# Altium footprint library ACTION_IC.PcbLib: 137 footprints (part 7 of 9)
Each footprint in its own frame and in the unit in brackets; x right, y up, seen from the top. Pads: shape width x height; smd on the part's side, far side on the other; paste and mask are expansions set on the pad; w line width, h text height; cw(c..) or ccw(c..) is an arc to the next point about the centre after c.
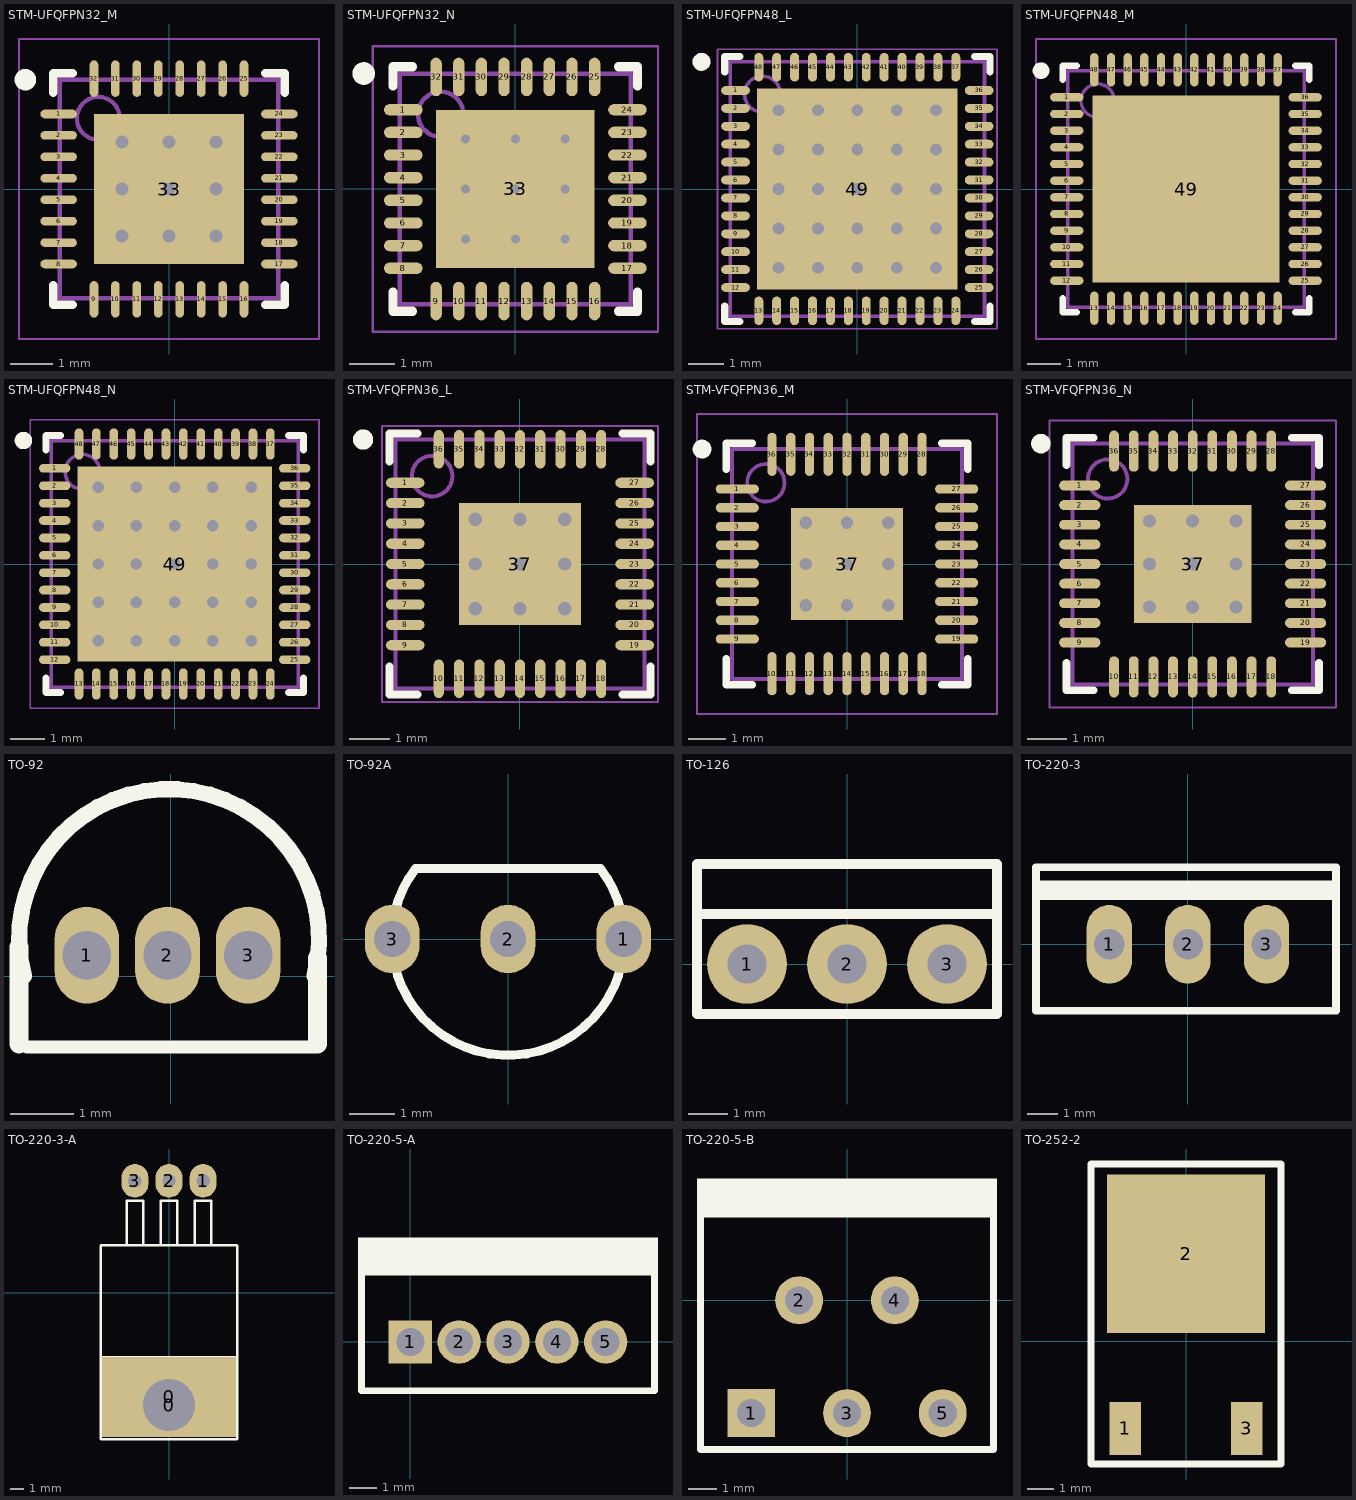
[diagram p6: the footprints below, top view; thin cyan lines are the x and y axes]

## STM-UFQFPN32_M [mm] "QFN, 32-Leads, Body 5.1x5.1mm, Pitch 0.5mm, Thermal Pad 3.5x3.5mm, IPC Low Density"
height 0.6
pads (33):
  oval 0.85x0.2 smd: 1(-2.575,1.75) 2(-2.575,1.25) 3(-2.575,0.75) 4(-2.575,0.25) 5(-2.575,-0.25) 6(-2.575,-0.75) 7(-2.575,-1.25) 8(-2.575,-1.75) 17(2.575,-1.75) 18(2.575,-1.25) 19(2.575,-0.75) 20(2.575,-0.25) 21(2.575,0.25) 22(2.575,0.75) 23(2.575,1.25) 24(2.575,1.75)
  oval 0.2x0.85 smd: 9(-1.75,-2.575) 10(-1.25,-2.575) 11(-0.75,-2.575) 12(-0.25,-2.575) 13(0.25,-2.575) 14(0.75,-2.575) 15(1.25,-2.575) 16(1.75,-2.575) 25(1.75,2.575) 26(1.25,2.575) 27(0.75,2.575) 28(0.25,2.575) 29(-0.25,2.575) 30(-0.75,2.575) 31(-1.25,2.575) 32(-1.75,2.575)
  rect 3.5x3.5 smd: 33(0,0)
via -1.1,1.1 diameter 0.5 hole 0.3
via 0,1.1 diameter 0.5 hole 0.3
via 1.1,1.1 diameter 0.5 hole 0.3
via -1.1,0 diameter 0.5 hole 0.3
via 0,0 diameter 0.5 hole 0.3
via 1.1,0 diameter 0.5 hole 0.3
via -1.1,-1.1 diameter 0.5 hole 0.3
via 0,-1.1 diameter 0.5 hole 0.3
via 1.1,-1.1 diameter 0.5 hole 0.3
Top Overlay:
  circle w0.25: c-3.35,2.55 r0.125
  lines w0.2: -2.7,-2.25 -2.7,-2.7 -2.25,-2.7 ; -2.7,2.25 -2.7,2.7 -2.25,2.7 ; 2.25,-2.7 2.7,-2.7 2.7,-2.25 ; 2.25,2.7 2.7,2.7 2.7,2.25
Mechanical 13:
  circle w0.1: c-1.65,1.65 r0.5
  lines w0.1: -2.55,-2.55 -2.55,2.55 2.55,2.55 2.55,-2.55 -2.55,-2.55
Mechanical 15:
  lines w0.05: -3.5,-3.5 -3.5,3.5 3.5,3.5 3.5,-3.5 -3.5,-3.5
  lines w0.1: -0.5,0 0.5,0 ; 0,-0.5 0,0.5
3D body: height 0.6, standoff 0, extent -2.55,-2.55 2.55,2.55

## STM-UFQFPN32_N [mm] "QFN, 32-Leads, Body 5.1x5.1mm, Pitch 0.5mm, Thermal Pad 3.5x3.5mm, IPC Medium Density"
height 0.6
pads (33):
  oval 0.85x0.25 smd: 1(-2.475,1.75) 2(-2.475,1.25) 3(-2.475,0.75) 4(-2.475,0.25) 5(-2.475,-0.25) 6(-2.475,-0.75) 7(-2.475,-1.25) 8(-2.475,-1.75) 17(2.475,-1.75) 18(2.475,-1.25) 19(2.475,-0.75) 20(2.475,-0.25) 21(2.475,0.25) 22(2.475,0.75) 23(2.475,1.25) 24(2.475,1.75)
  oval 0.25x0.85 smd: 9(-1.75,-2.475) 10(-1.25,-2.475) 11(-0.75,-2.475) 12(-0.25,-2.475) 13(0.25,-2.475) 14(0.75,-2.475) 15(1.25,-2.475) 16(1.75,-2.475) 25(1.75,2.475) 26(1.25,2.475) 27(0.75,2.475) 28(0.25,2.475) 29(-0.25,2.475) 30(-0.75,2.475) 31(-1.25,2.475) 32(-1.75,2.475)
  rect 3.5x3.5 smd: 33(0,0)
via 1.1,-1.1 diameter 0.5 hole 0.2
via 0,-1.1 diameter 0.5 hole 0.2
via -1.1,-1.1 diameter 0.5 hole 0.2
via 1.1,0 diameter 0.5 hole 0.2
via 0,0 diameter 0.5 hole 0.2
via -1.1,0 diameter 0.5 hole 0.2
via 1.1,1.1 diameter 0.5 hole 0.2
via 0,1.1 diameter 0.5 hole 0.2
via -1.1,1.1 diameter 0.5 hole 0.2
Top Overlay:
  circle w0.25: c-3.35,2.55 r0.125
  lines w0.2: -2.7,-2.275 -2.7,-2.7 -2.275,-2.7 ; -2.7,2.275 -2.7,2.7 -2.275,2.7 ; 2.275,-2.7 2.7,-2.7 2.7,-2.275 ; 2.275,2.7 2.7,2.7 2.7,2.275
Mechanical 13:
  circle w0.1: c-1.65,1.65 r0.5
  lines w0.1: -2.55,-2.55 2.55,-2.55 2.55,2.55 -2.55,2.55 -2.55,-2.55
Mechanical 15:
  lines w0.05: -3.15,-3.15 3.15,-3.15 3.15,3.15 -3.15,3.15 -3.15,-3.15
  lines w0.1: -0.5,0 0.5,0 ; 0,-0.5 0,0.5
3D body: height 0.6, standoff 0, extent -2.55,-2.55 2.55,2.55

## STM-UFQFPN48_L [mm] "QFN, 48-Leads, Body 7.1x7.1mm, Pitch 0.5mm, Thermal Pad 5.6x5.6mm, IPC High Density"
height 0.6
pads (49):
  oval 0.8x0.25 smd: 1(-3.4,2.75) 2(-3.4,2.25) 3(-3.4,1.75) 4(-3.4,1.25) 5(-3.4,0.75) 6(-3.4,0.25) 7(-3.4,-0.25) 8(-3.4,-0.75) 9(-3.4,-1.25) 10(-3.4,-1.75) 11(-3.4,-2.25) 12(-3.4,-2.75) 25(3.4,-2.75) 26(3.4,-2.25) 27(3.4,-1.75) 28(3.4,-1.25) 29(3.4,-0.75) 30(3.4,-0.25) 31(3.4,0.25) 32(3.4,0.75) 33(3.4,1.25) 34(3.4,1.75) 35(3.4,2.25) 36(3.4,2.75)
  oval 0.25x0.8 smd: 13(-2.75,-3.4) 14(-2.25,-3.4) 15(-1.75,-3.4) 16(-1.25,-3.4) 17(-0.75,-3.4) 18(-0.25,-3.4) 19(0.25,-3.4) 20(0.75,-3.4) 21(1.25,-3.4) 22(1.75,-3.4) 23(2.25,-3.4) 24(2.75,-3.4) 37(2.75,3.4) 38(2.25,3.4) 39(1.75,3.4) 40(1.25,3.4) 41(0.75,3.4) 42(0.25,3.4) 43(-0.25,3.4) 44(-0.75,3.4) 45(-1.25,3.4) 46(-1.75,3.4) 47(-2.25,3.4) 48(-2.75,3.4)
  rect 5.6x5.6 smd: 49(0,0)
via 2.2,-2.2 diameter 0.66 hole 0.33
via 1.1,-2.2 diameter 0.66 hole 0.33
via 0,-2.2 diameter 0.66 hole 0.33
via -1.1,-2.2 diameter 0.66 hole 0.33
via -2.2,-2.2 diameter 0.66 hole 0.33
via 2.2,-1.1 diameter 0.66 hole 0.33
via 1.1,-1.1 diameter 0.66 hole 0.33
via 0,-1.1 diameter 0.66 hole 0.33
via -1.1,-1.1 diameter 0.66 hole 0.33
via -2.2,-1.1 diameter 0.66 hole 0.33
via 2.2,0 diameter 0.66 hole 0.33
via 1.1,0 diameter 0.66 hole 0.33
via 0,0 diameter 0.66 hole 0.33
via -1.1,0 diameter 0.66 hole 0.33
via -2.2,0 diameter 0.66 hole 0.33
via 2.2,1.1 diameter 0.66 hole 0.33
via 1.1,1.1 diameter 0.66 hole 0.33
via 0,1.1 diameter 0.66 hole 0.33
via -1.1,1.1 diameter 0.66 hole 0.33
via -2.2,1.1 diameter 0.66 hole 0.33
via 2.2,2.2 diameter 0.66 hole 0.33
via 1.1,2.2 diameter 0.66 hole 0.33
via 0,2.2 diameter 0.66 hole 0.33
via -1.1,2.2 diameter 0.66 hole 0.33
via -2.2,2.2 diameter 0.66 hole 0.33
Top Overlay:
  circle w0.25: c-4.35,3.55 r0.125
  lines w0.2: -3.7,-3.275 -3.7,-3.7 -3.275,-3.7 ; -3.7,3.275 -3.7,3.7 -3.275,3.7 ; 3.275,-3.7 3.7,-3.7 3.7,-3.275 ; 3.275,3.7 3.7,3.7 3.7,3.275
Mechanical 13:
  circle w0.1: c-2.65,2.65 r0.5
  lines w0.1: -3.55,-3.55 3.55,-3.55 3.55,3.55 -3.55,3.55 -3.55,-3.55
Mechanical 15:
  lines w0.05: -3.9,-3.9 3.9,-3.9 3.9,3.9 -3.9,3.9 -3.9,-3.9
  lines w0.1: -0.5,0 0.5,0 ; 0,-0.5 0,0.5
3D body: height 0.6, standoff 0, extent -3.55,-3.55 3.55,3.55

## STM-UFQFPN48_M [mm] "QFN, 48-Leads, Body 7.1x7.1mm, Pitch 0.5mm, Thermal Pad 5.6x5.6mm, IPC Low Density"
height 0.6
pads (49):
  oval 1x0.25 smd: 1(-3.576,2.75) 2(-3.576,2.25) 3(-3.576,1.75) 4(-3.576,1.25) 5(-3.576,0.75) 6(-3.576,0.25) 7(-3.576,-0.25) 8(-3.576,-0.75) 9(-3.576,-1.25) 10(-3.576,-1.75) 11(-3.576,-2.25) 12(-3.576,-2.75) 25(3.576,-2.75) 26(3.576,-2.25) 27(3.576,-1.75) 28(3.576,-1.25) 29(3.576,-0.75) 30(3.576,-0.25) 31(3.576,0.25) 32(3.576,0.75) 33(3.576,1.25) 34(3.576,1.75) 35(3.576,2.25) 36(3.576,2.75)
  oval 0.25x1 smd: 13(-2.75,-3.576) 14(-2.25,-3.576) 15(-1.75,-3.576) 16(-1.25,-3.576) 17(-0.75,-3.576) 18(-0.25,-3.576) 19(0.25,-3.576) 20(0.75,-3.576) 21(1.25,-3.576) 22(1.75,-3.576) 23(2.25,-3.576) 24(2.75,-3.576) 37(2.75,3.576) 38(2.25,3.576) 39(1.75,3.576) 40(1.25,3.576) 41(0.75,3.576) 42(0.25,3.576) 43(-0.25,3.576) 44(-0.75,3.576) 45(-1.25,3.576) 46(-1.75,3.576) 47(-2.25,3.576) 48(-2.75,3.576)
  rect 5.6x5.6 smd: 49(0,0)
Top Overlay:
  circle w0.25: c-4.35,3.55 r0.125
  lines w0.2: -3.7,-3.275 -3.7,-3.7 -3.275,-3.7 ; -3.7,3.275 -3.7,3.7 -3.275,3.7 ; 3.275,-3.7 3.7,-3.7 3.7,-3.275 ; 3.275,3.7 3.7,3.7 3.7,3.275
Mechanical 13:
  circle w0.1: c-2.65,2.65 r0.5
  lines w0.1: -3.55,-3.55 -3.55,3.55 3.55,3.55 3.55,-3.55 -3.55,-3.55
Mechanical 15:
  lines w0.05: -4.5,-4.5 -4.5,4.5 4.5,4.5 4.5,-4.5 -4.5,-4.5
  lines w0.1: -0.5,0 0.5,0 ; 0,-0.5 0,0.5
3D body: height 0.6, standoff 0, extent -3.55,-3.55 3.55,3.55

## STM-UFQFPN48_N [mm] "QFN, 48-Leads, Body 7.1x7.1mm, Pitch 0.5mm, Thermal Pad 5.6x5.6mm, IPC Medium Density"
height 0.6
pads (49):
  oval 0.9x0.25 smd: 1(-3.45,2.75) 2(-3.45,2.25) 3(-3.45,1.75) 4(-3.45,1.25) 5(-3.45,0.75) 6(-3.45,0.25) 7(-3.45,-0.25) 8(-3.45,-0.75) 9(-3.45,-1.25) 10(-3.45,-1.75) 11(-3.45,-2.25) 12(-3.45,-2.75) 25(3.45,-2.75) 26(3.45,-2.25) 27(3.45,-1.75) 28(3.45,-1.25) 29(3.45,-0.75) 30(3.45,-0.25) 31(3.45,0.25) 32(3.45,0.75) 33(3.45,1.25) 34(3.45,1.75) 35(3.45,2.25) 36(3.45,2.75)
  oval 0.25x0.9 smd: 13(-2.75,-3.45) 14(-2.25,-3.45) 15(-1.75,-3.45) 16(-1.25,-3.45) 17(-0.75,-3.45) 18(-0.25,-3.45) 19(0.25,-3.45) 20(0.75,-3.45) 21(1.25,-3.45) 22(1.75,-3.45) 23(2.25,-3.45) 24(2.75,-3.45) 37(2.75,3.45) 38(2.25,3.45) 39(1.75,3.45) 40(1.25,3.45) 41(0.75,3.45) 42(0.25,3.45) 43(-0.25,3.45) 44(-0.75,3.45) 45(-1.25,3.45) 46(-1.75,3.45) 47(-2.25,3.45) 48(-2.75,3.45)
  rect 5.6x5.6 smd: 49(0,0)
via 2.2,-2.2 diameter 0.66 hole 0.33
via 1.1,-2.2 diameter 0.66 hole 0.33
via 0,-2.2 diameter 0.66 hole 0.33
via -1.1,-2.2 diameter 0.66 hole 0.33
via -2.2,-2.2 diameter 0.66 hole 0.33
via 2.2,-1.1 diameter 0.66 hole 0.33
via 1.1,-1.1 diameter 0.66 hole 0.33
via 0,-1.1 diameter 0.66 hole 0.33
via -1.1,-1.1 diameter 0.66 hole 0.33
via -2.2,-1.1 diameter 0.66 hole 0.33
via 2.2,0 diameter 0.66 hole 0.33
via 1.1,0 diameter 0.66 hole 0.33
via 0,0 diameter 0.66 hole 0.33
via -1.1,0 diameter 0.66 hole 0.33
via -2.2,0 diameter 0.66 hole 0.33
via 2.2,1.1 diameter 0.66 hole 0.33
via 1.1,1.1 diameter 0.66 hole 0.33
via 0,1.1 diameter 0.66 hole 0.33
via -1.1,1.1 diameter 0.66 hole 0.33
via -2.2,1.1 diameter 0.66 hole 0.33
via 2.2,2.2 diameter 0.66 hole 0.33
via 1.1,2.2 diameter 0.66 hole 0.33
via 0,2.2 diameter 0.66 hole 0.33
via -1.1,2.2 diameter 0.66 hole 0.33
via -2.2,2.2 diameter 0.66 hole 0.33
Top Overlay:
  circle w0.25: c-4.35,3.55 r0.125
  lines w0.2: -3.7,-3.275 -3.7,-3.7 -3.275,-3.7 ; -3.7,3.275 -3.7,3.7 -3.275,3.7 ; 3.275,-3.7 3.7,-3.7 3.7,-3.275 ; 3.275,3.7 3.7,3.7 3.7,3.275
Mechanical 13:
  circle w0.1: c-2.65,2.65 r0.5
  lines w0.1: -3.55,-3.55 3.55,-3.55 3.55,3.55 -3.55,3.55 -3.55,-3.55
Mechanical 15:
  lines w0.05: -4.15,-4.15 4.15,-4.15 4.15,4.15 -4.15,4.15 -4.15,-4.15
  lines w0.1: -0.5,0 0.5,0 ; 0,-0.5 0,0.5
3D body: height 0.6, standoff 0, extent -3.55,-3.55 3.55,3.55

## STM-VFQFPN36_L [mm] "QFN, 36-Leads, Body 6.13x6.13mm, Pitch 0.5mm, Thermal Pad 3x3mm, IPC High Density"
height 1
pads (37):
  oval 0.95x0.25 smd: 1(-2.825,2) 2(-2.825,1.5) 3(-2.825,1) 4(-2.825,0.5) 5(-2.825,0) 6(-2.825,-0.5) 7(-2.825,-1) 8(-2.825,-1.5) 9(-2.825,-2) 19(2.825,-2) 20(2.825,-1.5) 21(2.825,-1) 22(2.825,-0.5) 23(2.825,0) 24(2.825,0.5) 25(2.825,1) 26(2.825,1.5) 27(2.825,2)
  oval 0.25x0.95 smd: 10(-2,-2.825) 11(-1.5,-2.825) 12(-1,-2.825) 13(-0.5,-2.825) 14(0,-2.825) 15(0.5,-2.825) 16(1,-2.825) 17(1.5,-2.825) 18(2,-2.825) 28(2,2.825) 29(1.5,2.825) 30(1,2.825) 31(0.5,2.825) 32(0,2.825) 33(-0.5,2.825) 34(-1,2.825) 35(-1.5,2.825) 36(-2,2.825)
  rect 3x3 smd: 37(0,0)
via 1.1,-1.1 diameter 0.66 hole 0.33
via 0,-1.1 diameter 0.66 hole 0.33
via -1.1,-1.1 diameter 0.66 hole 0.33
via 1.1,0 diameter 0.66 hole 0.33
via 0,0 diameter 0.66 hole 0.33
via -1.1,0 diameter 0.66 hole 0.33
via 1.1,1.1 diameter 0.66 hole 0.33
via 0,1.1 diameter 0.66 hole 0.33
via -1.1,1.1 diameter 0.66 hole 0.33
Top Overlay:
  circle w0.25: c-3.865,3.065 r0.125
  lines w0.2: -3.215,-2.525 -3.215,-3.215 -2.525,-3.215 ; -3.215,2.525 -3.215,3.215 -2.525,3.215 ; 2.525,-3.215 3.215,-3.215 3.215,-2.525 ; 2.525,3.215 3.215,3.215 3.215,2.525
Mechanical 13:
  circle w0.1: c-2.165,2.165 r0.5
  lines w0.1: -3.065,-3.065 3.065,-3.065 3.065,3.065 -3.065,3.065 ; -3.063,-3.063 -3.063,3.063
Mechanical 15:
  lines w0.05: -3.4,-3.4 3.4,-3.4 3.4,3.4 -3.4,3.4 -3.4,-3.4
  lines w0.1: -0.5,0 0.5,0 ; 0,-0.5 0,0.5
3D body: height 1, standoff 0, extent -3.065,-3.065 3.065,3.065

## STM-VFQFPN36_M [mm] "QFN, 36-Leads, Body 6.13x6.13mm, Pitch 0.5mm, Thermal Pad 3x3mm, IPC Low Density"
height 1
pads (37):
  oval 1.15x0.25 smd: 1(-2.925,2) 2(-2.925,1.5) 3(-2.925,1) 4(-2.925,0.5) 5(-2.925,0) 6(-2.925,-0.5) 7(-2.925,-1) 8(-2.925,-1.5) 9(-2.925,-2) 19(2.925,-2) 20(2.925,-1.5) 21(2.925,-1) 22(2.925,-0.5) 23(2.925,0) 24(2.925,0.5) 25(2.925,1) 26(2.925,1.5) 27(2.925,2)
  oval 0.25x1.15 smd: 10(-2,-2.925) 11(-1.5,-2.925) 12(-1,-2.925) 13(-0.5,-2.925) 14(0,-2.925) 15(0.5,-2.925) 16(1,-2.925) 17(1.5,-2.925) 18(2,-2.925) 28(2,2.925) 29(1.5,2.925) 30(1,2.925) 31(0.5,2.925) 32(0,2.925) 33(-0.5,2.925) 34(-1,2.925) 35(-1.5,2.925) 36(-2,2.925)
  rect 3x3 smd: 37(0,0)
via 1.1,-1.1 diameter 0.66 hole 0.33
via 0,-1.1 diameter 0.66 hole 0.33
via -1.1,-1.1 diameter 0.66 hole 0.33
via 1.1,0 diameter 0.66 hole 0.33
via 0,0 diameter 0.66 hole 0.33
via -1.1,0 diameter 0.66 hole 0.33
via 1.1,1.1 diameter 0.66 hole 0.33
via 0,1.1 diameter 0.66 hole 0.33
via -1.1,1.1 diameter 0.66 hole 0.33
Top Overlay:
  circle w0.25: c-3.865,3.065 r0.125
  lines w0.2: -3.215,-2.525 -3.215,-3.215 -2.525,-3.215 ; -3.215,2.525 -3.215,3.215 -2.525,3.215 ; 2.525,-3.215 3.215,-3.215 3.215,-2.525 ; 2.525,3.215 3.215,3.215 3.215,2.525
Mechanical 13:
  circle w0.1: c-2.165,2.165 r0.5
  lines w0.1: -3.065,-3.065 3.065,-3.065 3.065,3.065 -3.065,3.065 -3.065,-3.065
Mechanical 15:
  lines w0.05: -4,-4 4,-4 4,4 -4,4 -4,-4
  lines w0.1: -0.5,0 0.5,0 ; 0,-0.5 0,0.5
3D body: height 1, standoff 0, extent -3.065,-3.065 3.065,3.065

## STM-VFQFPN36_N [mm] "QFN, 36-Leads, Body 6.13x6.13mm, Pitch 0.5mm, Thermal Pad 3x3mm, IPC Medium Density"
height 1
pads (37):
  oval 1.05x0.25 smd: 1(-2.875,2) 2(-2.875,1.5) 3(-2.875,1) 4(-2.875,0.5) 5(-2.875,0) 6(-2.875,-0.5) 7(-2.875,-1) 8(-2.875,-1.5) 9(-2.875,-2) 19(2.875,-2) 20(2.875,-1.5) 21(2.875,-1) 22(2.875,-0.5) 23(2.875,0) 24(2.875,0.5) 25(2.875,1) 26(2.875,1.5) 27(2.875,2)
  oval 0.25x1.05 smd: 10(-2,-2.875) 11(-1.5,-2.875) 12(-1,-2.875) 13(-0.5,-2.875) 14(0,-2.875) 15(0.5,-2.875) 16(1,-2.875) 17(1.5,-2.875) 18(2,-2.875) 28(2,2.875) 29(1.5,2.875) 30(1,2.875) 31(0.5,2.875) 32(0,2.875) 33(-0.5,2.875) 34(-1,2.875) 35(-1.5,2.875) 36(-2,2.875)
  rect 3x3 smd: 37(0,0)
via 1.1,-1.1 diameter 0.66 hole 0.33
via 0,-1.1 diameter 0.66 hole 0.33
via -1.1,-1.1 diameter 0.66 hole 0.33
via 1.1,0 diameter 0.66 hole 0.33
via 0,0 diameter 0.66 hole 0.33
via -1.1,0 diameter 0.66 hole 0.33
via 1.1,1.1 diameter 0.66 hole 0.33
via 0,1.1 diameter 0.66 hole 0.33
via -1.1,1.1 diameter 0.66 hole 0.33
Top Overlay:
  circle w0.25: c-3.865,3.065 r0.125
  lines w0.2: -3.215,-2.525 -3.215,-3.215 -2.525,-3.215 ; -3.215,2.525 -3.215,3.215 -2.525,3.215 ; 2.525,-3.215 3.215,-3.215 3.215,-2.525 ; 2.525,3.215 3.215,3.215 3.215,2.525
Mechanical 13:
  circle w0.1: c-2.165,2.165 r0.5
  lines w0.1: -3.065,-3.065 3.065,-3.065 3.065,3.065 -3.065,3.065 -3.065,-3.065
Mechanical 15:
  lines w0.05: -3.65,-3.65 3.65,-3.65 3.65,3.65 -3.65,3.65 -3.65,-3.65
  lines w0.1: -0.5,0 0.5,0 ; 0,-0.5 0,0.5
3D body: height 1, standoff 0, extent -3.065,-3.065 3.065,3.065

## TO-92 [mil]
pads (3):
  oval 40x60 hole 30: 1(-52,13) 2(-2,13) 3(48,13)
Top Overlay:
  lines w8: -89,-44 91,-44
  lines w10: -91,0 cw(c-1,23) 89,0
  lines w12: -94,-42 -94,18 ; 91,-42 91,11
3D body "TO-92A.STEP": height 314.96, standoff -118.11, extent -95.49,-51 93.49,103.73

## TO-92A [mm]
height 15.62
pads (3):
  oval 1.2x1.5 hole 0.8: 1(2.54,0) 2(0,0) 3(-2.54,0)
Top Overlay:
  lines w0.2: 0,-0.225 0,0.225 ; 0,0 -0.248,0 0.322,0 ; -2.025,1.55 ccw(c0,0) 2.025,1.55 -2.025,1.55
3D body "TO-92A.step": height 9.7, standoff -1.6, extent -2.76,-2.54 2.77,1.538

## TO-126 [mil]
pads (3):
  round 80 hole 39: 1(-100,0) 2(0,0) 3(100,0)
Top Overlay:
  lines w10: 150,40 150,100 -150,100 -150,50 ; -150,50 -150,-50 150,-50 150,50 -150,50
3D body "TO-126.STEP": height 560.6, standoff -533.89, extent -156.48,-78 158.48,49.96

## TO-220-3 [mm]
pads (3):
  oval 1.5x2.6 hole 1: 1(-2.6,0) 2(0,0) 3(2.6,0)
Top Overlay:
  rectangle: -5.025,1.47 4.9,2.118
  lines w0.254: -5.025,-2.2 4.9,-2.2 4.9,2.55 -5.025,2.55 -5.025,-2.2
3D body "TO-220A.step": height 19.3, standoff -9.08, extent -4.956,-2.33 4.696,2.17

## TO-220-3-A [mm]
pads (5):
  rect 10x6 smd: 0(0,-7.759)
  round 2 hole 3.88: 0(0,-8.37)
  oval 2x2.5 hole 1: 1(2.54,8.37) 2(0,8.37) 3(-2.54,8.37)
Top Overlay:
  lines w0.2: -5.08,-10.86 -5.08,-4.86 ; -5.08,-4.76 -5.08,3.52 ; -5.03,-10.91 5.03,-10.91 ; -5.03,-4.81 5.03,-4.81 ; -5.03,3.57 5.03,3.57 ; -3.15,3.57 -3.15,6.87 -1.93,6.87 -1.93,3.57 ; -0.61,3.57 -0.61,6.87 0.61,6.87 0.61,3.57 ; 1.93,3.57 1.93,6.87 3.15,6.87 3.15,3.57 ; 5.08,-10.86 5.08,-4.86 ; 5.08,-4.76 5.08,3.52
3D body "TO-220.step": height 4.45, standoff -1.79, extent -5.01,-10.69 5.15,8.59

## TO-220-5-A [mil]
pads (5):
  rect 62x62 hole 40: 1(0,0)
  round 62 hole 40: 2(70,0) 3(140,0) 4(210,0) 5(280,0)
Top Overlay:
  rectangle: -75,100 355,150
  lines w10: -70,-70 -70,100 350,100 350,-70 -70,-70
3D body "TO-220-5.STEP": height 269.78, standoff -143.39, extent -58.04,-786.01 342.04,8

## TO-220-5-B [mm]
pads (5):
  rect 1.7x1.7 hole 1: 1(-3.4,-4)
  round 1.7 hole 1: 2(-1.7,0) 3(0,-4) 4(1.7,0) 5(3.4,-4)
Top Overlay:
  rectangle: -5.325,3.06 5.325,4.33
  lines w0.254: 5.067,3.06 -5.2,3.06 -5.2,-5.3 5.2,-5.3 5.2,3.06
3D body "User Library-TO220-5B PCB.step": height 20.05, standoff -2.61, extent -5.08,-4.192 5.08,4.307

## TO-252-2 [mm]
pads (3):
  rect 1.2x2 smd: 1(-2.3,-3.312) 3(2.3,-3.312)
  rect 6x6 smd: 2(0,3.313)
Top Overlay:
  lines w0.254: -3.6,-4.662 -3.6,6.713 3.6,6.713 3.6,-4.662 -3.6,-4.662
3D body "TO-252.STEP": height 2.44, standoff 0.03, extent -3.27,-3.997 3.27,5.941